# Altium integrated library MOS-Power.IntLib: 37 symbols
Pins are listed as number, name and electrical type; pins without a type are passive.

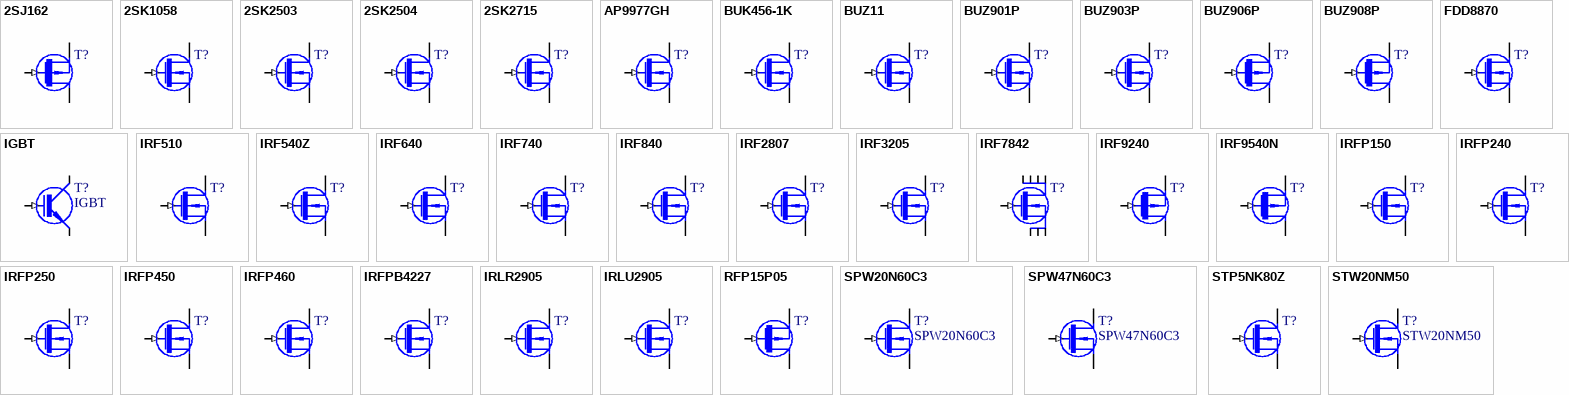
[diagram p0: symbols 2SJ162 to STW20NM50]

## 2SJ162
designator T?
Audio 160V 7A; Price: 1.3
footprint TO247-RA-800a
simulation model MSJ162 (Model Description)
pins: 1 G (in), 2 S (oe), 3 D (oc)

## 2SK1058
designator T?
Audio 160V  7A; price: 1.48
footprint TO247-RA-800a
simulation model MSK1058 (Model Description)
pins: 1 G (in), 2 S (oe), 3 D (oc)

## 2SK2503
designator T?
60V 0.11oM 5A; price: 0.7
footprint TO252AA
pins: 1 G (in), 2 D (oc), 3 S (oe)

## 2SK2504
designator T?
100V 5A 0.18oM/10V 0.25oM/4V; price: 0.62
footprint TO252AA
pins: 1 G (in), 2 D (oc), 3 S (oe)

## 2SK2715
designator T?
500V 4oM 2A; price: 0.62
footprint TO252AA
pins: 1 G (in), 2 D (oc), 3 S (oe)

## AP9977GH
designator T?
60V 0.1 oM 11A; price: 0.82
footprint TO252AA
pins: 1 G (in), 2 D (oc), 3 S (oe)

## BUK456-1K
designator T?
1000V 5oM 3.1A; price: 6.2
footprint TO220-1A 2.54
pins: 1 G (in), 2 D (oc), 3 S (oe)

## BUZ11
designator T?
50V 30moM33A; price: 1.05
footprint TO220-1A 2.54
pins: 1 G (in), 2 D (oc), 3 S (oe)

## BUZ901P
designator T?
Audio 200V  8A; price: 1.48
footprint TO247-RA-800a
simulation model BUZ901P (Model Description)
pins: 1 G (in), 2 S (oe), 3 D (oc)

## BUZ903P
designator T?
Audio 250V  8A; price: 1.48
footprint TO247-RA-800a
simulation model BUZ903P (Model Description)
pins: 1 G (in), 2 S (oe), 3 D (oc)

## BUZ906P
designator T?
Audio 200V 8A; Price: 1.3
footprint TO247-RA-800a
simulation model BUZ906P (Model Description)
pins: 1 G (in), 2 S (oe), 3 D (oc)

## BUZ908P
designator T?
Audio 250V 8A; Price: 1.3
footprint TO247-RA-800a
simulation model BUZ908P (Model Description)
pins: 1 G (in), 2 S (oe), 3 D (oc)

## FDD8870
designator T?
30V 3.9moM 160A; price: 2
footprint TO252AA
pins: 1 G (in), 2 D (oc), 3 S (oe)

## IGBT
designator T?
Price: 2
footprint TO247-h26
signal-integrity model Q (Model Description)
pins: 1 G (in), 2 C (oc), 3 E (oe)

## IRF510
designator T?
100V 0.54oM 5.6A; price: 1.48
footprint TO220-1A 2.54
simulation model IRF510 (Model Description)
pins: 1 G (in), 2 D (oc), 3 S (oe)

## IRF540Z
designator T?
100V 26.5moM 36A; price: 1.48
footprint TO220-1A 2.54
simulation model IRF540Z (Model Description)
pins: 1 G (in), 2 D (oc), 3 S (oe)

## IRF640
designator T?
200V 0.18oM 18A; price: 1.48
footprint TO220-1A 2.54
simulation model IRF640NS (Model Description)
pins: 1 G (in), 2 D (oc), 3 S (oe)

## IRF740
designator T?
400V 0.55oM 10A; price: 1.48
footprint TO220-1A 2.54
pins: 1 G (in), 2 D (oc), 3 S (oe)

## IRF840
designator T?
500v 0.85oM 8A; price: 1.48
footprint TO220-1A 2.54
pins: 1 G (in), 2 D (oc), 3 S (oe)

## IRF2807
designator T?
75V 13moM 82A; price: 2.15
footprint TO220-1A 2.54
pins: 1 G (in), 2 D (oc), 3 S (oe)

## IRF3205
designator T?
55V 8moM 110A; price: 2.15
footprint TO220-1A 2.54
simulation model IRF3205 (Model Description)
pins: 1 G (in), 2 D (oc), 3 S (oe)

## IRF7842
designator T?
55V 5moM 14A; price: 0.7
footprint SO8-150 (http://www.nxp.com/acrobat_download/packages/SOT096-1.pdf)
pins: 1 S (oe), 2 S, 3 G (in), 3 S, 5 D (oc), 6 D, 7 D, 8 D

## IRF9240
designator T?
200V 0.15oM 12A; Price: 1.3
footprint TO247-RA-800a
pins: 1 G (in), 2 D (oc), 3 S (oe)

## IRF9540N
designator T?
100V 0.117oM 23A; Price: 1.3
footprint TO220-1A 2.54
pins: 1 G (in), 2 D (oc), 3 S (oe)

## IRFP150
designator T?
100V 36moM 36A; price: 5.0
footprint TO247-h26mm
pins: 1 G (in), 2 D (oc), 3 S (oe)

## IRFP240
designator T?
200V 0.18oM 20A; price: 5.32
footprint TO247-RA-800a
simulation model IRFP240C (Model Description)
pins: 1 G (in), 2 D (oc), 3 S (oe)

## IRFP250
designator T?
200V 85moM 33A; Price: 2
footprint TO247-h26mm
pins: 1 G (in), 2 D (oc), 3 S (oe)

## IRFP450
designator T?
500V 0.38oM 14A; price: 5.32
footprint TO247-h26
simulation model IRFP450 (Model Description)
pins: 1 G (in), 2 D (oc), 3 S (oe)

## IRFP460
designator T?
500V 0.27om 18.4A; price: 5.32
footprint TO247-h26mm
pins: 1 G (in), 2 D (oc), 3 S (oe)

## IRFPB4227
designator T?
200V 24moM 130A; price: 3.4
footprint TO220-1A 2.54
footprint TO220-1A 5.08
footprint TO220-2A 2.54
footprint TO220-2A 5.08
pins: 1 G (in), 2 D (oc), 3 S (oe)

## IRLR2905
designator T?
55V 27moM 42A; price: 2
footprint TO252AA
pins: 1 G (in), 2 D (oc), 3 S (oe)

## IRLU2905
designator T?
55V 27moM 42A; price: 2
footprint TO251V
pins: 1 G (in), 2 D (oc), 3 S (oe)

## RFP15P05
designator T?
P 50V 15A 0.15om; price: 1.78
footprint TO220-1A 2.54
pins: 1 G (in), 2 D (oc), 3 S (oe)

## SPW20N60C3
designator T?
650V 0.19oM 20.7A; price: 5
footprint TO247-RA-800
pins: 1 G (in), 2 D (oc), 3 S (oe)

## SPW47N60C3
designator T?
650V 0.07oM 47A; price: 13.5
footprint TO247-RA-800
pins: 1 G (in), 2 D (oc), 3 S (oe)

## STP5NK80Z
designator T?
800V 2.4oM 4.2A; price: 1.2
footprint TO220-1A 2.54
pins: 1 G (in), 2 D (oc), 3 S (oe)

## STW20NM50
designator T?
500V 0.2oM 20A; price: 5.32
footprint TO247-RA-800
pins: 1 G (in), 2 D (oc), 3 S (oe)